# Altium footprint library 6-Connectors-4.PcbLib: 166 footprints (part 11 of 12) (continued)
## TYCO_1-1814655-5 [mm] "20 Positions, Pitch 2.54mm, Width 2.54mm, Heigh 4.4mm, SIP Straight Socket" (continued)
3D body "TYCO_1-1814655-5.stp": height 4.4, standoff -2.9, extent -1.27,-1.27 49.53,1.27

## TYCO_1-1814655-5_A [mm] "1 of 20 Positions, Pitch 2.54mm, Width 2.54mm, Heigh 4.4mm, SIP Straight Socket"
height 4.4
pads (1):
  round 1.5 hole 0.8: 1(0,0)
Top Overlay:
  lines w0.2: -1.27,-0.77 -1.27,0.77 -0.77,1.27 0.77,1.27 1.27,0.77 1.27,-0.77 0.77,-1.27 -0.77,-1.27 -1.27,-0.77
Mechanical 8:
  lines w0.1: -1,0 0,0 ; 0,-1 0,0 ; 0,1 0,0 ; 1,0 0,0
Mechanical 14:
  lines w0.1: -1.27,-0.77 -1.27,0.77 -0.77,1.27 0.77,1.27 1.27,0.77 1.27,-0.77 0.77,-1.27 -0.77,-1.27 -1.27,-0.77
3D body "TYCO_1-1814655-5_a.stp": height 4.4, standoff -2.9, extent -1.27,-1.27 1.27,1.27

## TYCO_5-104655-6 [mm] "2x25 Position, 1.27mm Pitch, Surface Mount, AMPMODU Male Connector"
height 5.78
pads (52):
  rect 0.75x4.1 smd: 1(-15.24,-2.33) 2(-15.24,2.33) 3(-13.97,-2.33) 4(-13.97,2.33) 5(-12.7,-2.33) 6(-12.7,2.33) 7(-11.43,-2.33) 8(-11.43,2.33) 9(-10.16,-2.33) 10(-10.16,2.33) 11(-8.89,-2.33) 12(-8.89,2.33) 13(-7.62,-2.33) 14(-7.62,2.33) 15(-6.35,-2.33) 16(-6.35,2.33) 17(-5.08,-2.33) 18(-5.08,2.33) 19(-3.81,-2.33) 20(-3.81,2.33) 21(-2.54,-2.33) 22(-2.54,2.33) 23(-1.27,-2.33) 24(-1.27,2.33) 25(0,-2.33) 26(0,2.33) 27(1.27,-2.33) 28(1.27,2.33) 29(2.54,-2.33) 30(2.54,2.33) 31(3.81,-2.33) 32(3.81,2.33) 33(5.08,-2.33) 34(5.08,2.33) 35(6.35,-2.33) 36(6.35,2.33) 37(7.62,-2.33) 38(7.62,2.33) 39(8.89,-2.33) 40(8.89,2.33) 41(10.16,-2.33) 42(10.16,2.33) 43(11.43,-2.33) 44(11.43,2.33) 45(12.7,-2.33) 46(12.7,2.33) 47(13.97,-2.33) 48(13.97,2.33) 49(15.24,-2.33) 50(15.24,2.33)
  round 1.7 hole 1.2 unplated: 51(-16.79,0) 52(16.79,0)
Top Overlay:
  circle w0.25: c-16.889,-3.556 r0.125
  lines w0.2: -17.424,-1.27 -16.408,-1.27 -16.408,-1.867 -16.015,-1.867 ; -17.424,-1.077 -17.424,-2.858 -16.015,-2.858 ; -17.424,1.077 -17.424,2.858 -16.015,2.858 ; -17.424,1.27 -16.408,1.27 -16.408,1.867 -16.015,1.867 ; 16.015,-2.858 17.424,-2.858 17.424,-1.077 ; 16.015,-1.867 16.408,-1.867 16.408,-1.27 17.424,-1.27 ; 16.015,2.324 16.408,2.324 16.408,1.27 17.424,1.27 ; 16.015,2.858 17.424,2.858 17.424,1.077
  text "1" at -16.328,-4.081 h1
  text "50" at 15.868,3.168 h1
Mechanical 8:
  lines w0.1: -17.79,0 -16.79,0 ; -16.79,-1 -16.79,0 ; -16.79,1 -16.79,0 ; -15.79,0 -16.79,0 ; -15.24,-3.33 -15.24,-2.33 ; -15.24,-1.33 -15.24,-2.33 ; -15.24,1.33 -15.24,2.33 ; -15.24,3.33 -15.24,2.33 ; -13.97,-3.33 -13.97,-2.33 -13.97,-1.33 ; -13.97,1.33 -13.97,2.33 -13.97,3.33 ; -12.7,-3.33 -12.7,-2.33 -12.7,-1.33 ; -12.7,1.33 -12.7,2.33 -12.7,3.33 ; -11.43,-3.33 -11.43,-2.33 -11.43,-1.33 ; -11.43,1.33 -11.43,2.33 -11.43,3.33 ; -10.16,-3.33 -10.16,-2.33 -10.16,-1.33 ; -10.16,1.33 -10.16,2.33 -10.16,3.33 ; -8.89,-3.33 -8.89,-2.33 -8.89,-1.33 ; -8.89,1.33 -8.89,2.33 -8.89,3.33 ; -7.62,-3.33 -7.62,-2.33 -7.62,-1.33 ; -7.62,1.33 -7.62,2.33 -7.62,3.33 ; -6.35,-3.33 -6.35,-2.33 -6.35,-1.33 ; -6.35,1.33 -6.35,2.33 -6.35,3.33 ; -5.08,-3.33 -5.08,-2.33 -5.08,-1.33 ; -5.08,1.33 -5.08,2.33 -5.08,3.33 ; -3.81,-3.33 -3.81,-2.33 -3.81,-1.33 ; -3.81,1.33 -3.81,2.33 -3.81,3.33 ; -2.54,-3.33 -2.54,-2.33 -2.54,-1.33 ; -2.54,1.33 -2.54,2.33 -2.54,3.33 ; -1.27,-3.33 -1.27,-2.33 -1.27,-1.33 ; -1.27,1.33 -1.27,2.33 -1.27,3.33 ; -1,0 0,0 ; 0,-3.33 0,-2.33 0,-1.33 ; 0,-1 0,0 ; 0,1 0,0 ; 0,1.33 0,2.33 0,3.33 ; 1,0 0,0 ; 1.27,-3.33 1.27,-2.33 1.27,-1.33 ; 1.27,1.33 1.27,2.33 1.27,3.33 ; 2.54,-3.33 2.54,-2.33 2.54,-1.33 ; 2.54,1.33 2.54,2.33 2.54,3.33 ; 3.81,-3.33 3.81,-2.33 3.81,-1.33 ; 3.81,1.33 3.81,2.33 3.81,3.33 ; 5.08,-3.33 5.08,-2.33 5.08,-1.33 ; 5.08,1.33 5.08,2.33 5.08,3.33 ; 6.35,-3.33 6.35,-2.33 6.35,-1.33 ; 6.35,1.33 6.35,2.33 6.35,3.33 ; 7.62,-3.33 7.62,-2.33 7.62,-1.33 ; 7.62,1.33 7.62,2.33 7.62,3.33 ; 8.89,-3.33 8.89,-2.33 8.89,-1.33 ; 8.89,1.33 8.89,2.33 8.89,3.33 ; 10.16,-3.33 10.16,-2.33 10.16,-1.33 ; 10.16,1.33 10.16,2.33 10.16,3.33 ; 11.43,-3.33 11.43,-2.33 11.43,-1.33 ; 11.43,1.33 11.43,2.33 11.43,3.33 ; 12.7,-3.33 12.7,-2.33 12.7,-1.33 ; 12.7,1.33 12.7,2.33 12.7,3.33 ; 13.97,-3.33 13.97,-2.33 13.97,-1.33 ; 13.97,1.33 13.97,2.33 13.97,3.33 ; 15.24,-3.33 15.24,-2.33 ; 15.24,-1.33 15.24,-2.33 ; 15.24,1.33 15.24,2.33 ; 15.24,3.33 15.24,2.33 ; 15.79,0 16.79,0 ; 16.79,-1 16.79,0 ; 16.79,1 16.79,0 ; 17.79,0 16.79,0 ; -15.24,-2.33 15.24,-2.33 ; -15.24,2.33 15.24,2.33
Mechanical 14:
  drawing of 297 lines, arcs and shapes, not listed
  text "1" at -16.328,-4.081 h1
  text "50" at 15.868,3.168 h1
3D body "p410-075.stp": height 0.02, standoff 0, extent 14.865,0.28 15.615,4.38
3D body "p410-075.stp": height 0.02, standoff 0, extent 14.865,-4.38 15.615,-0.28
3D body "p410-075.stp": height 0.02, standoff 0, extent 13.595,0.28 14.345,4.38
3D body "p410-075.stp": height 0.02, standoff 0, extent 13.595,-4.38 14.345,-0.28
3D body "p410-075.stp": height 0.02, standoff 0, extent 12.325,0.28 13.075,4.38
3D body "p410-075.stp": height 0.02, standoff 0, extent 12.325,-4.38 13.075,-0.28
3D body "p410-075.stp": height 0.02, standoff 0, extent 11.055,0.28 11.805,4.38
3D body "p410-075.stp": height 0.02, standoff 0, extent 11.055,-4.38 11.805,-0.28
3D body "p410-075.stp": height 0.02, standoff 0, extent 9.785,0.28 10.535,4.38
3D body "p410-075.stp": height 0.02, standoff 0, extent 9.785,-4.38 10.535,-0.28
3D body "p410-075.stp": height 0.02, standoff 0, extent 8.515,0.28 9.265,4.38
3D body "p410-075.stp": height 0.02, standoff 0, extent 8.515,-4.38 9.265,-0.28
3D body "p410-075.stp": height 0.02, standoff 0, extent 7.245,0.28 7.995,4.38
3D body "p410-075.stp": height 0.02, standoff 0, extent 7.245,-4.38 7.995,-0.28
3D body "p410-075.stp": height 0.02, standoff 0, extent 5.975,0.28 6.725,4.38
3D body "p410-075.stp": height 0.02, standoff 0, extent 5.975,-4.38 6.725,-0.28
3D body "p410-075.stp": height 0.02, standoff 0, extent 4.705,0.28 5.455,4.38
3D body "p410-075.stp": height 0.02, standoff 0, extent 4.705,-4.38 5.455,-0.28
3D body "p410-075.stp": height 0.02, standoff 0, extent 3.435,0.28 4.185,4.38
3D body "p410-075.stp": height 0.02, standoff 0, extent 3.435,-4.38 4.185,-0.28
3D body "p410-075.stp": height 0.02, standoff 0, extent 2.165,0.28 2.915,4.38
3D body "p410-075.stp": height 0.02, standoff 0, extent 2.165,-4.38 2.915,-0.28
3D body "p410-075.stp": height 0.02, standoff 0, extent 0.895,0.28 1.645,4.38
3D body "p410-075.stp": height 0.02, standoff 0, extent 0.895,-4.38 1.645,-0.28
3D body "p410-075.stp": height 0.02, standoff 0, extent -0.375,0.28 0.375,4.38
3D body "p410-075.stp": height 0.02, standoff 0, extent -0.375,-4.38 0.375,-0.28
3D body "p410-075.stp": height 0.02, standoff 0, extent -1.645,0.28 -0.895,4.38
3D body "p410-075.stp": height 0.02, standoff 0, extent -1.645,-4.38 -0.895,-0.28
3D body "p410-075.stp": height 0.02, standoff 0, extent -2.915,0.28 -2.165,4.38
3D body "p410-075.stp": height 0.02, standoff 0, extent -2.915,-4.38 -2.165,-0.28
3D body "p410-075.stp": height 0.02, standoff 0, extent -4.185,0.28 -3.435,4.38
3D body "p410-075.stp": height 0.02, standoff 0, extent -4.185,-4.38 -3.435,-0.28
3D body "p410-075.stp": height 0.02, standoff 0, extent -5.455,0.28 -4.705,4.38
3D body "p410-075.stp": height 0.02, standoff 0, extent -5.455,-4.38 -4.705,-0.28
3D body "p410-075.stp": height 0.02, standoff 0, extent -6.725,0.28 -5.975,4.38
3D body "p410-075.stp": height 0.02, standoff 0, extent -6.725,-4.38 -5.975,-0.28
3D body "p410-075.stp": height 0.02, standoff 0, extent -7.995,0.28 -7.245,4.38
3D body "p410-075.stp": height 0.02, standoff 0, extent -7.995,-4.38 -7.245,-0.28
3D body "p410-075.stp": height 0.02, standoff 0, extent -9.265,-4.38 -8.515,-0.28
3D body "p410-075.stp": height 0.02, standoff 0, extent -9.265,0.28 -8.515,4.38
3D body "p410-075.stp": height 0.02, standoff 0, extent -10.535,0.28 -9.785,4.38
3D body "p410-075.stp": height 0.02, standoff 0, extent -10.535,-4.38 -9.785,-0.28
3D body "p410-075.stp": height 0.02, standoff 0, extent -11.805,-4.38 -11.055,-0.28
3D body "p410-075.stp": height 0.02, standoff 0, extent -11.805,0.28 -11.055,4.38
3D body "p410-075.stp": height 0.02, standoff 0, extent -13.075,0.28 -12.325,4.38
3D body "p410-075.stp": height 0.02, standoff 0, extent -13.075,-4.38 -12.325,-0.28
3D body "p410-075.stp": height 0.02, standoff 0, extent -14.345,-4.38 -13.595,-0.28
3D body "p410-075.stp": height 0.02, standoff 0, extent -14.345,0.28 -13.595,4.38
3D body "p410-075.stp": height 0.02, standoff 0, extent -15.615,-4.38 -14.865,-0.28
3D body "p410-075.stp": height 0.02, standoff 0, extent -15.615,0.28 -14.865,4.38
3D body "TYCO_5-104655-6.stp": height 5.8, standoff -1.2, extent -17.405,-3.619 17.444,3.62

## TYCO_7-215079-8 [mm] "8 Contacts Micro-MaTch Board-Board & Ribbon-Board Connectors"
height 4.1
pads (8):
  round 1.4 hole 0.8: 1(-4.445,-1.27) 2(-3.175,1.27) 3(-1.905,-1.27) 4(-0.635,1.27) 5(0.635,-1.27) 6(1.905,1.27) 7(3.175,-1.27) 8(4.445,1.27)
Top Overlay:
  circle w0.3: c-4.468,-3.048 r0.15
  lines w0.2: -5.445,-1.25 -6.045,-1.25 -6.045,-2.5 6.045,-2.5 6.045,-1.25 5.315,-1.25 ; -5.315,-1.763 -5.315,-2 -5.128,-2 ; -5.315,-0.777 -5.315,2 -3.858,2 ; -5.315,1.25 -6.045,1.25 -6.045,2.5 6.045,2.5 6.045,1.25 5.445,1.25 ; -3.762,-2 -2.588,-2 ; -2.492,2 -1.318,2 ; -1.222,-2 -0.048,-2 ; 0.048,2 1.222,2 ; 1.318,-2 2.492,-2 ; 2.588,2 3.762,2 ; 3.858,-2 5.315,-2 5.315,0.777 ; 5.128,2 5.315,2 5.315,1.763
  text "1" at -5.969,-1.016 h1
  text "8" at 5.613,-0.075 h1
Mechanical 8:
  lines w0.1: -5.445,-1.27 -4.445,-1.27 ; -4.445,-2.27 -4.445,-1.27 ; -4.445,-0.27 -4.445,-1.27 ; -4.175,1.27 -3.175,1.27 ; -3.445,-1.27 -4.445,-1.27 ; -3.175,0.27 -3.175,1.27 ; -3.175,2.27 -3.175,1.27 ; -2.905,-1.27 -1.905,-1.27 ; -2.175,1.27 -3.175,1.27 ; -1.905,-2.27 -1.905,-1.27 ; -1.905,-0.27 -1.905,-1.27 ; -1.635,1.27 -0.635,1.27 ; -1,0 0,0 ; -0.905,-1.27 -1.905,-1.27 ; -0.635,0.27 -0.635,1.27 ; -0.635,2.27 -0.635,1.27 ; -0.365,-1.27 0.635,-1.27 ; 0,-1 0,0 ; 0,1 0,0 ; 0.365,1.27 -0.635,1.27 ; 0.635,-2.27 0.635,-1.27 ; 0.635,-0.27 0.635,-1.27 ; 0.905,1.27 1.905,1.27 ; 1,0 0,0 ; 1.635,-1.27 0.635,-1.27 ; 1.905,0.27 1.905,1.27 ; 1.905,2.27 1.905,1.27 ; 2.175,-1.27 3.175,-1.27 ; 2.905,1.27 1.905,1.27 ; 3.175,-2.27 3.175,-1.27 ; 3.175,-0.27 3.175,-1.27 ; 3.445,1.27 4.445,1.27 ; 4.175,-1.27 3.175,-1.27 ; 4.445,0.27 4.445,1.27 ; 4.445,2.27 4.445,1.27 ; 5.445,1.27 4.445,1.27
Mechanical 14:
  drawing of 208 lines, arcs and shapes, not listed
  text "1" at -5.969,-1.016 h1
  text "8" at 5.613,-0.075 h1
3D body "TYCO_7-215079-8.stp": height 4, standoff -3, extent -6.045,-2.5 6.045,2.5

## TYCO_826629-2 [mm] "2 Contacts Straight Strip Header Pitch 2.54mm L=6.7mm ''Mini-Wire-Wrap''"
height 9.5
pads (2):
  round 1.7 hole 1: 1(0,0) 2(2.54,0)
Top Overlay:
  circle w0.3: c-0.508,1.778 r0.15
  lines w0.2: 1.27,-1.025 1.07,-1.225 -1.07,-1.225 -1.27,-1.025 -1.27,1.025 -1.07,1.225 1.07,1.225 1.27,1.025 ; 1.27,-1.025 1.27,1.025 ; 1.27,-1.025 1.47,-1.225 3.61,-1.225 3.81,-1.025 3.81,1.025 3.61,1.225 1.47,1.225 1.27,1.025
Mechanical 14:
  circle w0.3: c-0.508,1.778 r0.15
  lines w0.1: 1.27,-1.025 1.07,-1.225 -1.07,-1.225 -1.27,-1.025 -1.27,1.025 -1.07,1.225 1.07,1.225 1.27,1.025 ; 1.27,-1.025 1.27,1.025 ; 1.27,-1.025 1.47,-1.225 3.61,-1.225 3.81,-1.025 3.81,1.025 3.61,1.225 1.47,1.225 1.27,1.025
3D body "TYCO_826629-2.stp": height 9.5, standoff -3.2, extent -1.22,-1.25 3.86,1.25

## TYCO_1814655-3 [mm] "4 Positions, Pitch 2.54mm, Width 2.54mm, Heigh 4.4mm, SIP Straight Socket"
height 4.4
pads (4):
  round 1.5 hole 0.8: 1(0,0) 2(2.54,0) 3(5.08,0) 4(7.62,0)
Top Overlay:
  lines w0.2: 1.27,-0.77 1.27,0.77 ; 1.27,-0.77 1.77,-1.27 3.31,-1.27 3.81,-0.77 ; 1.27,-0.77 0.77,-1.27 -0.77,-1.27 -1.27,-0.77 -1.27,0.77 -0.77,1.27 0.77,1.27 1.27,0.77 ; 1.27,0.77 1.77,1.27 3.31,1.27 3.81,0.77 ; 3.81,-0.77 3.81,0.77 ; 3.81,-0.77 4.31,-1.27 5.85,-1.27 6.35,-0.77 ; 3.81,0.77 4.31,1.27 5.85,1.27 6.35,0.77 ; 6.35,-0.77 6.35,0.77 ; 6.35,-0.77 6.85,-1.27 8.39,-1.27 8.89,-0.77 8.89,0.77 8.39,1.27 6.85,1.27 6.35,0.77
Mechanical 8:
  lines w0.1: -1,0 0,0 ; 0,-1 0,0 ; 0,1 0,0 ; 1,0 0,0 ; 1.54,0 2.54,0 ; 2.54,-1 2.54,0 ; 2.54,1 2.54,0 ; 3.54,0 2.54,0 ; 4.08,0 5.08,0 ; 5.08,-1 5.08,0 ; 5.08,1 5.08,0 ; 6.08,0 5.08,0 ; 6.62,0 7.62,0 ; 7.62,-1 7.62,0 ; 7.62,1 7.62,0 ; 8.62,0 7.62,0
Mechanical 14:
  lines w0.1: 1.27,-0.77 1.27,0.77 ; 1.27,-0.77 1.77,-1.27 3.31,-1.27 3.81,-0.77 ; 1.27,-0.77 0.77,-1.27 -0.77,-1.27 -1.27,-0.77 -1.27,0.77 -0.77,1.27 0.77,1.27 1.27,0.77 ; 1.27,0.77 1.77,1.27 3.31,1.27 3.81,0.77 ; 3.81,-0.77 3.81,0.77 ; 3.81,-0.77 4.31,-1.27 5.85,-1.27 6.35,-0.77 ; 3.81,0.77 4.31,1.27 5.85,1.27 6.35,0.77 ; 6.35,-0.77 6.35,0.77 ; 6.35,-0.77 6.85,-1.27 8.39,-1.27 8.89,-0.77 8.89,0.77 8.39,1.27 6.85,1.27 6.35,0.77
3D body "TYCO_1814655-3.stp": height 4.4, standoff -2.9, extent -1.27,-1.27 8.89,1.27

## TYCO_1814655-7 [mm] "10 Positions, Pitch 2.54mm, Width 2.54mm, Heigh 4.4mm, SIP Straight Socket"
height 4.4
pads (10):
  round 1.5 hole 0.8: 1(0,0) 2(2.54,0) 3(5.08,0) 4(7.62,0) 5(10.16,0) 6(12.7,0) 7(15.24,0) 8(17.78,0) 9(20.32,0) 10(22.86,0)
Top Overlay:
  lines w0.2: 1.27,-0.77 1.27,0.77 ; 1.27,-0.77 1.77,-1.27 3.31,-1.27 3.81,-0.77 ; 1.27,-0.77 0.77,-1.27 -0.77,-1.27 -1.27,-0.77 -1.27,0.77 -0.77,1.27 0.77,1.27 1.27,0.77 ; 1.27,0.77 1.77,1.27 3.31,1.27 3.81,0.77 ; 3.81,-0.77 3.81,0.77 ; 3.81,-0.77 4.31,-1.27 5.85,-1.27 6.35,-0.77 ; 3.81,0.77 4.31,1.27 5.85,1.27 6.35,0.77 ; 6.35,-0.77 6.35,0.77 ; 6.35,-0.77 6.85,-1.27 8.39,-1.27 8.89,-0.77 ; 6.35,0.77 6.85,1.27 8.39,1.27 8.89,0.77 ; 8.89,-0.77 8.89,0.77 ; 8.89,-0.77 9.39,-1.27 10.93,-1.27 11.43,-0.77 ; 8.89,0.77 9.39,1.27 10.93,1.27 11.43,0.77 ; 11.43,-0.77 11.43,0.77 ; 11.43,-0.77 11.93,-1.27 13.47,-1.27 13.97,-0.77 ; 11.43,0.77 11.93,1.27 13.47,1.27 13.97,0.77 ; 13.97,-0.77 13.97,0.77 ; 13.97,-0.77 14.47,-1.27 16.01,-1.27 16.51,-0.77 ; 13.97,0.77 14.47,1.27 16.01,1.27 16.51,0.77 ; 16.51,-0.77 16.51,0.77 ; 16.51,-0.77 17.01,-1.27 18.55,-1.27 19.05,-0.77 ; 16.51,0.77 17.01,1.27 18.55,1.27 19.05,0.77 ; 19.05,-0.77 19.05,0.77 ; 19.05,-0.77 19.55,-1.27 21.09,-1.27 21.59,-0.77 ; 19.05,0.77 19.55,1.27 21.09,1.27 21.59,0.77 ; 21.59,-0.77 21.59,0.77 ; 21.59,-0.77 22.09,-1.27 23.63,-1.27 24.13,-0.77 24.13,0.77 23.63,1.27 22.09,1.27 21.59,0.77
Mechanical 8:
  lines w0.1: -1,0 0,0 ; 0,-1 0,0 ; 0,1 0,0 ; 1,0 0,0 ; 1.54,0 2.54,0 ; 2.54,-1 2.54,0 ; 2.54,1 2.54,0 ; 3.54,0 2.54,0 ; 4.08,0 5.08,0 ; 5.08,-1 5.08,0 ; 5.08,1 5.08,0 ; 6.08,0 5.08,0 ; 6.62,0 7.62,0 ; 7.62,-1 7.62,0 ; 7.62,1 7.62,0 ; 8.62,0 7.62,0 ; 9.16,0 10.16,0 ; 10.16,-1 10.16,0 ; 10.16,1 10.16,0 ; 11.16,0 10.16,0 ; 11.7,0 12.7,0 ; 12.7,-1 12.7,0 ; 12.7,1 12.7,0 ; 13.7,0 12.7,0 ; 14.24,0 15.24,0 ; 15.24,-1 15.24,0 ; 15.24,1 15.24,0 ; 16.24,0 15.24,0 ; 16.78,0 17.78,0 ; 17.78,-1 17.78,0 ; 17.78,1 17.78,0 ; 18.78,0 17.78,0 ; 19.32,0 20.32,0 ; 20.32,-1 20.32,0 ; 20.32,1 20.32,0 ; 21.32,0 20.32,0 ; 21.86,0 22.86,0 ; 22.86,-1 22.86,0 ; 22.86,1 22.86,0 ; 23.86,0 22.86,0
Mechanical 14:
  lines w0.1: 1.27,-0.77 1.27,0.77 ; 1.27,-0.77 1.77,-1.27 3.31,-1.27 3.81,-0.77 ; 1.27,-0.77 0.77,-1.27 -0.77,-1.27 -1.27,-0.77 -1.27,0.77 -0.77,1.27 0.77,1.27 1.27,0.77 ; 1.27,0.77 1.77,1.27 3.31,1.27 3.81,0.77 ; 3.81,-0.77 3.81,0.77 ; 3.81,-0.77 4.31,-1.27 5.85,-1.27 6.35,-0.77 ; 3.81,0.77 4.31,1.27 5.85,1.27 6.35,0.77 ; 6.35,-0.77 6.35,0.77 ; 6.35,-0.77 6.85,-1.27 8.39,-1.27 8.89,-0.77 ; 6.35,0.77 6.85,1.27 8.39,1.27 8.89,0.77 ; 8.89,-0.77 8.89,0.77 ; 8.89,-0.77 9.39,-1.27 10.93,-1.27 11.43,-0.77 ; 8.89,0.77 9.39,1.27 10.93,1.27 11.43,0.77 ; 11.43,-0.77 11.43,0.77 ; 11.43,-0.77 11.93,-1.27 13.47,-1.27 13.97,-0.77 ; 11.43,0.77 11.93,1.27 13.47,1.27 13.97,0.77 ; 13.97,-0.77 13.97,0.77 ; 13.97,-0.77 14.47,-1.27 16.01,-1.27 16.51,-0.77 ; 13.97,0.77 14.47,1.27 16.01,1.27 16.51,0.77 ; 16.51,-0.77 16.51,0.77 ; 16.51,-0.77 17.01,-1.27 18.55,-1.27 19.05,-0.77 ; 16.51,0.77 17.01,1.27 18.55,1.27 19.05,0.77 ; 19.05,-0.77 19.05,0.77 ; 19.05,-0.77 19.55,-1.27 21.09,-1.27 21.59,-0.77 ; 19.05,0.77 19.55,1.27 21.09,1.27 21.59,0.77 ; 21.59,-0.77 21.59,0.77 ; 21.59,-0.77 22.09,-1.27 23.63,-1.27 24.13,-0.77 24.13,0.77 23.63,1.27 22.09,1.27 21.59,0.77
3D body "TYCO_1814655-7.stp": height 4.4, standoff -2.9, extent -1.27,-1.27 24.13,1.27

## TYCO_5103310-5 [mm] "20 Contacts - Right Angle Double-Row .100'' x .100'' Low Profile Four-Wall Header, AMP-LATCH Serie"
height 9.14
pads (20):
  round 1.7 hole 1: 1(-11.43,-1.27) 2(-11.43,1.27) 3(-8.89,-1.27) 4(-8.89,1.27) 5(-6.35,-1.27) 6(-6.35,1.27) 7(-3.81,-1.27) 8(-3.81,1.27) 9(-1.27,-1.27) 10(-1.27,1.27) 11(1.27,-1.27) 12(1.27,1.27) 13(3.81,-1.27) 14(3.81,1.27) 15(6.35,-1.27) 16(6.35,1.27) 17(8.89,-1.27) 18(8.89,1.27) 19(11.43,-1.27) 20(11.43,1.27)
Top Overlay:
  circle w0.3: c-13.2,-1.27 r0.15
  lines w0.2: -13.97,2.057 -12.7,4.257 -11.656,2.449 ; -12.336,2.057 -15.367,2.057 -15.367,1.016 -16.51,1.016 -16.51,10.871 16.51,10.871 16.51,1.016 15.367,1.016 15.367,2.057 12.336,2.057 ; -2.604,10.871 cw(c-2.604,10.363) -2.096,10.363 -2.095,4.14 ccw(c-1.333,4.14) -1.334,3.378 1.333,3.378 ccw(c1.333,4.14) 2.095,4.17 2.095,10.363 cw(c2.604,10.363) 2.604,10.871 ; -2.095,4.394 2.095,4.394 ; -1.581,4.394 -1.581,10.49 -0.959,10.49 -0.959,4.394 ; 0.959,4.394 0.959,10.49 1.581,10.49 1.581,4.394
  text "20" at 12.915,0.207 h1.02
Mechanical 8:
  lines w0.1: -11.93,-1.27 -11.43,-1.27 ; -11.93,1.27 -11.43,1.27 ; -11.43,-1.77 -11.43,-1.27 ; -11.43,-0.77 -11.43,-1.27 ; -11.43,0.77 -11.43,1.27 ; -11.43,1.77 -11.43,1.27 ; -10.93,-1.27 -11.43,-1.27 ; -10.93,1.27 -11.43,1.27 ; -9.39,-1.27 -8.89,-1.27 ; -9.39,1.27 -8.89,1.27 ; -8.89,-1.77 -8.89,-1.27 ; -8.89,-0.77 -8.89,-1.27 ; -8.89,0.77 -8.89,1.27 ; -8.89,1.77 -8.89,1.27 ; -8.39,-1.27 -8.89,-1.27 ; -8.39,1.27 -8.89,1.27 ; -6.85,-1.27 -6.35,-1.27 ; -6.85,1.27 -6.35,1.27 ; -6.35,-1.77 -6.35,-1.27 ; -6.35,-0.77 -6.35,-1.27 ; -6.35,0.77 -6.35,1.27 ; -6.35,1.77 -6.35,1.27 ; -5.85,-1.27 -6.35,-1.27 ; -5.85,1.27 -6.35,1.27 ; -4.31,-1.27 -3.81,-1.27 ; -4.31,1.27 -3.81,1.27 ; -3.81,-1.77 -3.81,-1.27 ; -3.81,-0.77 -3.81,-1.27 ; -3.81,0.77 -3.81,1.27 ; -3.81,1.77 -3.81,1.27 ; -3.31,-1.27 -3.81,-1.27 ; -3.31,1.27 -3.81,1.27 ; -1.77,-1.27 -1.27,-1.27 ; -1.77,1.27 -1.27,1.27 ; -1.27,-1.77 -1.27,-1.27 ; -1.27,-0.77 -1.27,-1.27 ; -1.27,0.77 -1.27,1.27 ; -1.27,1.77 -1.27,1.27 ; -0.77,-1.27 -1.27,-1.27 ; -0.77,1.27 -1.27,1.27 ; -0.5,0 0,0 ; 0,-0.5 0,0 ; 0,0.5 0,0 ; 0.5,0 0,0 ; 0.77,-1.27 1.27,-1.27 ; 0.77,1.27 1.27,1.27 ; 1.27,-1.77 1.27,-1.27 ; 1.27,-0.77 1.27,-1.27 ; 1.27,0.77 1.27,1.27 ; 1.27,1.77 1.27,1.27 ; 1.77,-1.27 1.27,-1.27 ; 1.77,1.27 1.27,1.27 ; 3.31,-1.27 3.81,-1.27 ; 3.31,1.27 3.81,1.27 ; 3.81,-1.77 3.81,-1.27 ; 3.81,-0.77 3.81,-1.27 ; 3.81,0.77 3.81,1.27 ; 3.81,1.77 3.81,1.27 ; 4.31,-1.27 3.81,-1.27 ; 4.31,1.27 3.81,1.27 ; 5.85,-1.27 6.35,-1.27 ; 5.85,1.27 6.35,1.27 ; 6.35,-1.77 6.35,-1.27 ; 6.35,-0.77 6.35,-1.27 ; 6.35,0.77 6.35,1.27 ; 6.35,1.77 6.35,1.27 ; 6.85,-1.27 6.35,-1.27 ; 6.85,1.27 6.35,1.27 ; 8.39,-1.27 8.89,-1.27 ; 8.39,1.27 8.89,1.27 ; 8.89,-1.77 8.89,-1.27 ; 8.89,-0.77 8.89,-1.27 ; 8.89,0.77 8.89,1.27 ; 8.89,1.77 8.89,1.27 ; 9.39,-1.27 8.89,-1.27 ; 9.39,1.27 8.89,1.27 ; 10.93,-1.27 11.43,-1.27 ; 10.93,1.27 11.43,1.27 ; 11.43,-1.77 11.43,-1.27 ; 11.43,-0.77 11.43,-1.27 ; 11.43,0.77 11.43,1.27 ; 11.43,1.77 11.43,1.27 ; 11.93,-1.27 11.43,-1.27 ; 11.93,1.27 11.43,1.27
Mechanical 14:
  circle w0.3: c-13.2,-1.27 r0.15
  lines w0.1: -13.97,2.057 -12.7,4.257 -11.43,2.057 ; -11.938,2.057 -11.938,1.676 -11.741,1.676 ; -11.741,2.057 -11.741,-1.581 -11.119,-1.581 -11.119,2.057 ; -11.119,1.676 -10.922,1.676 -10.922,2.057 ; -9.398,2.057 -9.398,1.676 -9.201,1.676 ; -9.201,2.057 -9.201,-1.581 -8.579,-1.581 -8.579,2.057 ; -8.579,1.676 -8.382,1.676 -8.382,2.057 ; -6.858,2.057 -6.858,1.676 -6.661,1.676 ; -6.661,2.057 -6.661,-1.581 -6.039,-1.581 -6.039,2.057 ; -6.039,1.676 -5.842,1.676 -5.842,2.057 ; -4.318,2.057 -4.318,1.676 -4.121,1.676 ; -4.121,2.057 -4.121,-1.581 -3.499,-1.581 -3.499,2.057 ; -3.499,1.676 -3.302,1.676 -3.302,2.057 ; -2.604,10.871 cw(c-2.604,10.363) -2.096,10.363 -2.095,4.14 ccw(c-1.333,4.14) -1.334,3.378 1.333,3.378 ccw(c1.333,4.14) 2.095,4.17 2.095,10.363 cw(c2.604,10.363) 2.604,10.871 ; -2.095,4.394 2.095,4.394 ; -1.778,2.057 -1.778,1.676 -1.581,1.676 ; -1.581,2.057 -1.581,-1.581 -0.959,-1.581 -0.959,2.057 ; -1.581,4.394 -1.581,10.49 -0.959,10.49 -0.959,4.394 ; -0.959,1.676 -0.762,1.676 -0.762,2.057 ; 0.762,2.057 0.762,1.676 0.959,1.676 ; 0.959,2.057 0.959,-1.581 1.581,-1.581 1.581,2.057 ; 0.959,4.394 0.959,10.49 1.581,10.49 1.581,4.394 ; 1.581,1.676 1.778,1.676 1.778,2.057 ; 3.302,2.057 3.302,1.676 3.499,1.676 ; 3.499,2.057 3.499,-1.581 4.121,-1.581 4.121,2.057 ; 4.121,1.676 4.318,1.676 4.318,2.057 ; 5.842,2.057 5.842,1.676 6.039,1.676 ; 6.039,2.057 6.039,-1.581 6.661,-1.581 6.661,2.057 ; 6.661,1.676 6.858,1.676 6.858,2.057 ; 8.382,2.057 8.382,1.676 8.579,1.676 ; 8.579,2.057 8.579,-1.581 9.201,-1.581 9.201,2.057 ; 9.201,1.676 9.398,1.676 9.398,2.057 ; 10.922,2.057 10.922,1.676 11.119,1.676 ; 11.119,2.057 11.119,-1.581 11.741,-1.581 11.741,2.057 ; 11.741,1.676 11.938,1.676 11.938,2.057 ; -16.51,1.016 -15.367,1.016 -15.367,2.057 15.367,2.057 15.367,1.016 16.51,1.016 16.51,10.871 -16.51,10.871 -16.51,1.016
  text "20" at 12.915,0.207 h1.02
3D body "TYCO_5103310-5.stp": height 9.14, standoff -3.43, extent -16.51,-1.581 16.51,10.871

## WAGO_256-746 [mm] "24A 630VAC Modular PCB terminal block 2 solder pins / pole 1 pole pin Pitch 5mm, CAGE CLAMP?Connection"
height 18.2
pads (2):
  round 1.9 hole 1.2: 1(0,-2.5) 1(0,2.5)
Top Overlay:
  lines w0.2: -2.85,0.09 -2.85,0.35 -2.15,0.35 ; -2.5,4.135 -3.75,4.135 -3.75,5.335 -2.5,5.335 ; -2.5,5.832 -3.75,5.832 -3.75,7.032 -2.15,7.032 ; -2.15,-7.332 2.85,-7.332 ; -2.15,-5.341 -3.75,-5.341 -3.75,-4.141 -2.15,-4.141 ; -2.15,-1.947 -1.232,-1.947 ; -2.15,-1.51 -3.75,-1.51 -3.75,0.09 -2.15,0.09 ; -2.15,0.138 2.85,0.138 ; -2.15,0.547 2.85,0.547 ; -2.15,1.187 2.85,1.187 ; -2.15,3.448 -2.15,-7.522 2.85,-7.522 2.85,-2.31 ; -2.15,6.349 -2.15,7.5 2.85,7.5 2.85,6.078 4.15,6.078 ; -1.315,-3.68 -1.8,-3.68 -1.8,-6.826 ; -1.144,-3.217 -1.3,-3.599 -1.3,-4.811 ; -0.615,3.702 -1.9,3.702 -1.9,3.448 -2.5,3.448 -2.5,6.349 -0.85,6.349 -0.85,6.669 0.75,6.669 0.75,6.349 2.4,6.349 2.4,3.448 1.8,3.448 1.8,3.702 0.615,3.702 ; 1.05,-3.248 1.05,-4.811 ; 1.076,-3.316 1.215,-3.68 2.45,-3.68 2.45,-6.826 ; 1.232,-1.947 2.85,-1.947 ; 2.85,-1.304 2.85,-2.31 ; 2.85,-0.356 4.15,-0.356 ; 2.85,1.553 4.15,1.553 ; 2.85,2.091 2.85,-2.31 ; 3.55,-0.356 3.55,-2.31 ; -1.8,-6.826 -1.3,-4.811 ; -1.8,-6.826 2.45,-6.826 ; -1.3,-4.811 1.05,-4.811 ; 1.05,-4.811 2.45,-6.826 ; 2.85,-2.31 3.55,-2.31 ; 2.85,-2.31 3.55,-2.31 ; 4.15,-0.356 4.15,6.078 ; 4.15,-0.356 4.15,6.078
Mechanical 8:
  lines w0.1: -0.5,-2.5 0,-2.5 ; -0.5,0 0,0 ; -0.5,2.5 0,2.5 ; 0,-3 0,-2.5 ; 0,-2 0,-2.5 ; 0,-0.5 0,0 ; 0,0.5 0,0 ; 0,2 0,2.5 ; 0,3 0,2.5 ; 0.5,-2.5 0,-2.5 ; 0.5,0 0,0 ; 0.5,2.5 0,2.5
Mechanical 14:
  lines w0.1: -2.85,0.09 -2.85,0.35 -2.15,0.35 ; -2.5,4.135 -3.75,4.135 -3.75,5.335 -2.5,5.335 ; -2.5,5.25 -1.9,5.25 ; -2.5,5.832 -3.75,5.832 -3.75,7.032 -2.15,7.032 ; -2.15,-7.332 2.85,-7.332 ; -2.15,-5.341 -3.75,-5.341 -3.75,-4.141 -2.15,-4.141 ; -2.15,-2.831 -0.989,-2.831 ; -2.15,-2.124 2.85,-2.124 ; -2.15,-1.947 2.85,-1.947 ; -2.15,-1.51 -3.75,-1.51 -3.75,0.09 -2.15,0.09 ; -2.15,0.138 2.85,0.138 ; -2.15,0.547 2.85,0.547 ; -2.15,1.187 2.85,1.187 ; -2.15,2.091 2.85,2.091 2.85,-2.31 ; -2.15,3.448 -2.15,-7.522 2.85,-7.522 2.85,-2.31 ; -2.15,6.349 -2.15,7.5 2.85,7.5 2.85,6.078 4.15,6.078 ; -1.9,3.702 1.8,3.702 ; -1.9,4.091 1.8,4.091 ; -1.9,4.978 1.8,4.978 ; -1.9,5.31 1.8,5.31 ; -1.9,5.728 1.8,5.728 ; -1.9,6.349 -1.9,3.448 -2.5,3.448 -2.5,6.349 -0.85,6.349 ; -1.315,-3.68 -1.8,-3.68 -1.8,-6.826 ; -0.85,2.091 -0.85,3.702 ; -0.85,2.327 0.75,2.327 ; 0.75,2.091 0.75,3.702 ; 0.75,6.349 2.4,6.349 2.4,3.448 1.8,3.448 1.8,6.349 ; 0.888,-2.831 2.85,-2.831 ; 1.05,-3.248 1.05,-4.811 ; 1.8,5.25 2.4,5.25 ; 2.4,3.672 4.15,3.672 ; 2.4,5.573 4.15,5.573 ; 2.85,-0.356 4.15,-0.356 ; 2.85,1.553 4.15,1.553 ; -1.8,-6.826 -1.3,-4.811 ; -1.8,-6.826 2.45,-6.826 ; -1.3,-4.811 -1.3,-3.599 -1.05,-2.986 -1.05,-2.896 cw(c-0.05,-3.785) 0.95,-2.897 0.95,-2.986 1.215,-3.68 2.45,-3.68 2.45,-6.826 ; -1.3,-4.811 1.05,-4.811 ; 1.05,-4.811 2.45,-6.826 ; 2.85,-2.31 3.55,-2.31 ; 2.85,-2.31 3.55,-2.31 ; 3.55,-2.31 3.55,-0.356 3.55,-2.31 ; 4.15,-0.356 4.15,6.078 ; 4.15,-0.356 4.15,6.078 ; -0.85,5.803 0.75,5.803 0.75,6.669 -0.85,6.669 -0.85,5.803
3D body "WAGO_256-746.stp": height 18.81, standoff -4, extent -3.75,-7.525 4.15,7.5